# Altium footprint library 陪测板.PcbLib: 72 footprints (part 5 of 5)
Each footprint in its own frame and in the unit in brackets; x right, y up, seen from the top. Pads: shape width x height; smd on the part's side, far side on the other; paste and mask are expansions set on the pad; w line width, h text height; cw(c..) or ccw(c..) is an arc to the next point about the centre after c.
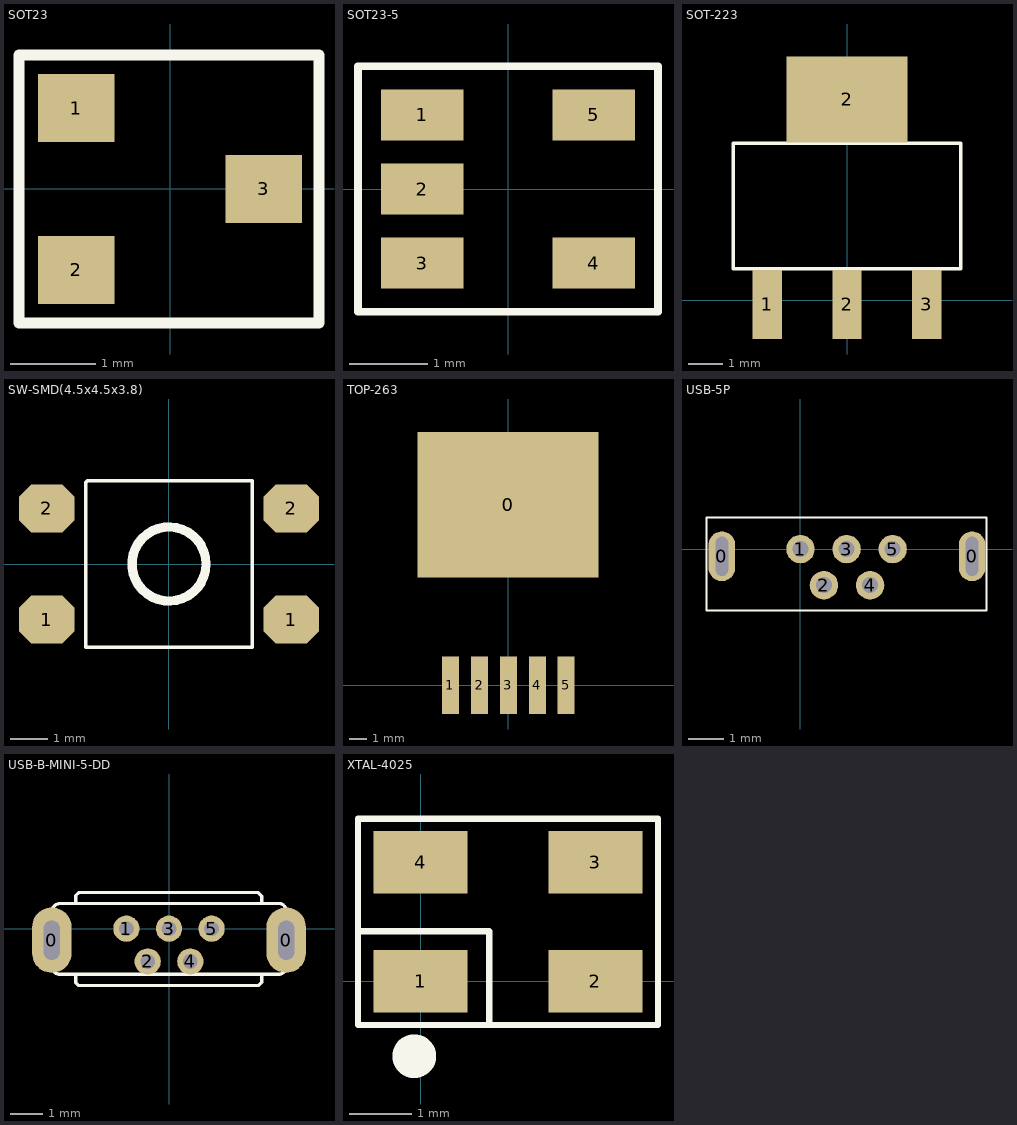
[diagram p4: the footprints below, top view; thin cyan lines are the x and y axes]

## SOT23 [mm]
height 5.5
pads (3):
  rect 0.9x0.8 smd: 1(-1.1,0.95) 2(-1.1,-0.95) 3(1.1,0)
Top Overlay:
  lines w0.127: -1.775,-1.575 1.75,-1.575 1.75,1.575 -1.775,1.575 -1.775,-1.575
3D body "SOT-23-3.STEP": height 1.2, standoff 0, extent -1.4,-1.45 1.4,1.45

## SOT23-5 [mm]
height 1.2
pads (5):
  rect 1.06x0.65 smd: 1(-1.1,0.95) 2(-1.1,0) 3(-1.1,-0.95) 4(1.1,-0.95) 5(1.1,0.95)
Top Overlay:
  lines w0.1: -1.925,-1.575 -1.925,1.575 1.925,1.575 1.925,-1.575 -1.925,-1.575
3D body "SOT-23-5.STEP": height 1.2, standoff 0, extent -1.4,-1.45 1.4,1.45

## SOT-223 [mm]
pads (4):
  rect 0.85x2 smd: 1(-2.311,-0.127) 2(0,-0.127) 3(2.311,-0.127)
  rect 3.5x2.5 smd: 2(0,5.817)
Top Overlay:
  lines w0.1: -3.302,0.914 -3.302,4.547 3.302,4.547 3.302,0.914 -3.302,0.914

## SW-SMD(4.5x4.5x3.8) [mm] "轻触开关"
height 1.2
pads (4):
  oct 1.5x1.3 smd: 1(-3.3,-1.5) 1(3.3,-1.5) 2(-3.3,1.5) 2(3.3,1.5)
Top Overlay:
  circle w0.254: c0,0 r1
  lines w0.1: -2.25,2.2 -2.2,2.25 ; -2.25,2.2 -2.2,2.25 ; -2.25,2.2 -2.25,-2.25 2.25,-2.25 2.25,2.25 -2.2,2.25
3D body "开关(4.5x4.5x3.8).STEP": height 3.8, standoff 0, extent -3.25,-2.3 3.25,2.2

## TOP-263 [mm]
pads (6):
  rect 10.7x8.6 smd: 0(-0.025,10.643)
  rect 1x3.4 smd: 1(-3.429,0) 2(-1.702,0) 3(0,0) 4(1.702,0) 5(3.404,0)

## USB-5P [mm]
pads (7):
  oval 0.75x1.4 hole 0.35 slot 1.1 at 90 deg: 0(-2.21,-0.203) 0(4.826,-0.203)
  round 0.8 hole 0.45: 1(0,0) 2(0.66,-1.016) 3(1.295,0) 4(1.956,-1.016) 5(2.591,0)
Top Overlay:
  lines w0.05: -2.642,-1.727 -2.642,0.889 5.232,0.889 5.232,-1.727 -2.642,-1.727

## USB-B-MINI-5-DD [mm]
pads (7):
  oval 1.2x2 hole 0.5 slot 1.2 at 90 deg: 0(-3.575,-0.35) 0(3.575,-0.35)
  round 0.8 hole 0.45: 1(-1.3,0) 2(-0.65,-1) 3(0,0) 4(0.65,-1) 5(1.3,0)
Top Overlay:
  lines w0.1: -3.325,0.764 ccw(c-3.325,0.514) -3.575,0.514 -3.575,-0.35 -3.575,-1.145 ccw(c-3.328,-1.145) -3.328,-1.392 3.347,-1.392 ccw(c3.347,-1.168) 3.571,-1.168 ; -3.325,0.769 3.348,0.769 ; -2.846,-1.394 -2.846,-1.65 -2.765,-1.731 2.742,-1.731 2.833,-1.64 2.833,-1.392 ; -2.846,0.78 -2.846,1.011 -2.758,1.099 2.727,1.099 2.833,0.993 2.833,0.776 ; 3.347,0.769 cw(c3.348,0.542) 3.575,0.544 ; 3.575,-1.168 3.575,-0.35 3.575,0.542
3D body: height 5.65, standoff 0, extent -3.575,-1.392 3.575,0.769
3D body: height 1.2, standoff 0, extent -1.427,-0.1 -1.173,0.1
3D body: height 1.2, standoff 0, extent -0.127,-0.1 0.127,0.1
3D body: height 1.2, standoff 0, extent 1.173,-0.1 1.427,0.1
3D body: height 1.2, standoff 0, extent 0.523,-1.1 0.777,-0.9
3D body: height 1.2, standoff 0, extent -0.777,-1.1 -0.523,-0.9
3D body: height 1.2, standoff 0, extent -3.711,-0.686 -3.439,-0.014
3D body: height 1.2, standoff 0, extent 3.439,-0.686 3.711,-0.014

## XTAL-4025 [mm]
pads (4):
  rect 1.5x1 smd: 1(0,0) 2(2.8,0) 3(2.8,1.9) 4(0,1.9)
Top Overlay:
  circle w0.5: c-0.1,-1.2 r0.1
  lines w0.1: -1,0.8 1.1,0.8 1.1,-0.7 ; -1,-0.7 -1,2.6 3.8,2.6 3.8,-0.7 -1,-0.7
3D body "晶振4025.STEP": height 0.7, standoff -0.01, extent -0.584,-0.33 3.416,2.17